# Altium footprint library B105rlc.PcbLib: 103 footprints (part 1 of 7)
Each footprint in its own frame and in the unit in brackets; x right, y up, seen from the top. Pads: shape width x height; smd on the part's side, far side on the other; paste and mask are expansions set on the pad; w line width, h text height; cw(c..) or ccw(c..) is an arc to the next point about the centre after c.
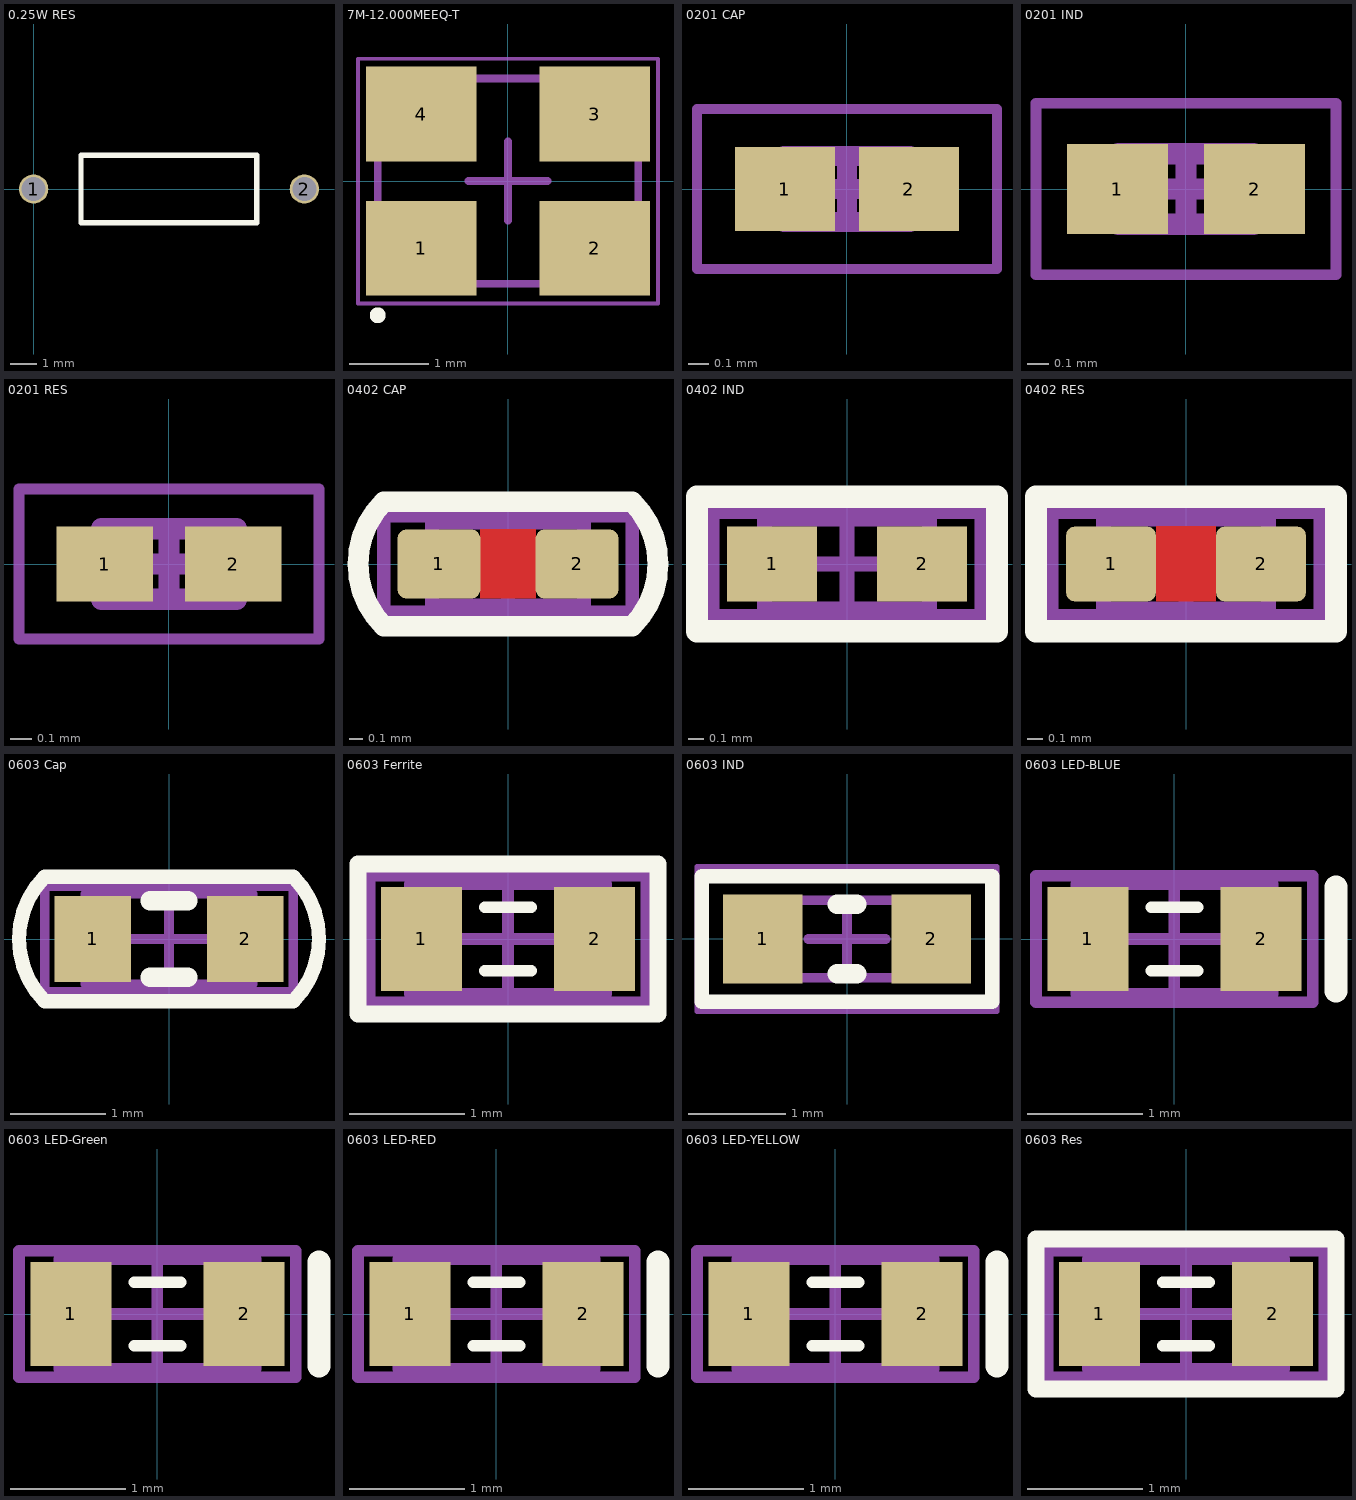
[diagram p0: the footprints below, top view; thin cyan lines are the x and y axes]

## 0.25W RES [mm]
pads (2):
  round 1.1 hole 0.9: 1(0,0) 2(10.167,0)
Top Overlay:
  lines w0.2: 1.778,-1.27 1.778,1.27 8.382,1.27 8.382,-1.27 1.778,-1.27
3D body "RESISTOR  0_25 W  0_4 IN LEAD PITCH.step": height 2.93, standoff -2.54, extent -0.254,-1.143 10.516,1.168

## 7M-12.000MEEQ-T [mm] "DFN, 4-Leads, Body 2,50x3,20mm, Pitch 2,10mm, IPC Medium Density"
height 0.8
pads (4):
  rect 1.4x1.2 smd: 1(-1.1,-0.85) 2(1.1,-0.85) 3(1.1,0.85) 4(-1.1,0.85)
Top Overlay:
  circle w0.1: c-1.65,-1.7 r0.05
Mechanical 13:
  lines w0.1: -1.65,-1.3 1.65,-1.3 1.65,1.3 -1.65,1.3 -1.65,-1.3
Mechanical 15:
  lines w0.05: -1.9,-1.55 1.9,-1.55 1.9,1.55 -1.9,1.55 -1.9,-1.55
  lines w0.1: -0.5,0 0.5,0 ; 0,-0.5 0,0.5
3D body "7M-12.000MEEQ-T.step": height 0.8, standoff 0, extent -1.65,-1.3 1.65,1.3

## 0201 CAP [mm] "Chip Capacitor, 2-Leads, Body 0,60x0,30mm, 0201, IPC Medium Density"
height 0.33
pads (2):
  rect 0.5x0.42 smd: 1(-0.31,0) 2(0.31,0)
Mechanical 13:
  lines w0.1: -0.315,-0.165 0.315,-0.165 0.315,0.165 -0.315,0.165 -0.315,-0.165
Mechanical 15:
  lines w0.05: -0.75,-0.4 0.75,-0.4 0.75,0.4 -0.75,0.4 -0.75,-0.4
  lines w0.1: -0.165,0 0.165,0 ; 0,-0.165 0,0.165
3D body "0201CAP.step": height 0.15, standoff -0.15, extent -0.3,-0.15 0.3,0.15

## 0201 IND [mm] "Chip Inductor, 2-Leads, Body 0,60x0,30mm, 0201, IPC Medium Density"
height 0.33
pads (2):
  rect 0.47x0.42 smd: 1(-0.32,0) 2(0.32,0)
Mechanical 13:
  lines w0.1: -0.315,-0.165 0.315,-0.165 0.315,0.165 -0.315,0.165 -0.315,-0.165
Mechanical 15:
  lines w0.05: -0.7,-0.4 0.7,-0.4 0.7,0.4 -0.7,0.4 -0.7,-0.4
  lines w0.1: -0.165,0 0.165,0 ; 0,-0.165 0,0.165
3D body "0201 IND.step": height 0.33, standoff 0, extent -0.315,-0.165 0.315,0.165

## 0201 RES [mm] "Chip Resistor, 2-Leads, Body 0,60x0,30mm, 0201, IPC Medium Density"
height 0.26
pads (2):
  rect 0.45x0.35 smd: 1(-0.3,0) 2(0.3,0)
Mechanical 13:
  lines w0.1: -0.315,-0.165 -0.315,0.165 0.315,0.165 0.315,-0.165 -0.315,-0.165
Mechanical 15:
  lines w0.05: -0.7,-0.35 -0.7,0.35 0.7,0.35 0.7,-0.35 -0.7,-0.35
  lines w0.1: -0.165,0 0.165,0 ; 0,-0.165 0,0.165
3D body "0201RES.step": height 0.34, standoff 0, extent -0.34,-0.165 0.34,0.165

## 0402 CAP [mm] "Chip Capacitor, Body 1.0x0.5mm, IPC High Density"
height 1.3
pads (2):
  rrect25% 0.6x0.5 smd: 1(-0.5,0) 2(0.5,0)
Top Layer:
  pour cut-out: -0.2,0.25 -0.2,-0.25 0.2,-0.25 0.2,0.25
Top Overlay:
  lines w0.15: -0.9,-0.45 cw(c-0.45,0) -0.9,0.45 0.9,0.45 cw(c0.45,0) 0.9,-0.45 -0.9,-0.45
Mechanical 13:
  lines w0.1: -0.55,-0.3 -0.55,0.3 0.55,0.3 0.55,-0.3 -0.55,-0.3
Mechanical 15:
  lines w0.1: -0.3,0 0.3,0 ; 0,-0.3 0,0.3 ; -0.9,-0.35 -0.9,0.35 0.9,0.35 0.9,-0.35 -0.9,-0.35
3D body "User Library-SMD CAPACITOR.STEP": height 0.49, standoff -0.01, extent -0.5,-0.25 0.5,0.25

## 0402 IND [mm] "Chip Inductor, Body 1.0x0.5mm, IPC High Density"
height 1.3
pads (2):
  rect 0.6x0.5 smd: 1(-0.5,0) 2(0.5,0)
Top Overlay:
  lines w0.15: -1,-0.45 1,-0.45 1,0.45 -1,0.45 -1,-0.45
Mechanical 13:
  lines w0.1: -0.55,-0.3 0.55,-0.3 0.55,0.3 -0.55,0.3 -0.55,-0.3
Mechanical 15:
  lines w0.1: -0.3,0 0.3,0 ; 0,-0.3 0,0.3 ; -0.9,-0.35 0.9,-0.35 0.9,0.35 -0.9,0.35 -0.9,-0.35
3D body "0402Ind.step": height 0.25, standoff 0, extent -0.5,-0.25 0.5,0.25

## 0402 RES [mm] "Chip Resistor, Body 1.0x0.5mm, IPC High Density"
height 0.4
pads (2):
  rrect25% 0.6x0.5 smd: 1(-0.5,0) 2(0.5,0)
Top Layer:
  pour cut-out: -0.2,0.25 -0.2,-0.25 0.2,-0.25 0.2,0.25
Top Overlay:
  lines w0.15: -1,-0.45 1,-0.45 1,0.45 -1,0.45 -1,-0.45
Mechanical 13:
  lines w0.1: -0.55,-0.3 0.55,-0.3 0.55,0.3 -0.55,0.3 -0.55,-0.3
Mechanical 15:
  lines w0.1: -0.3,0 0.3,0 ; 0,-0.3 0,0.3 ; -0.9,-0.35 0.9,-0.35 0.9,0.35 -0.9,0.35 -0.9,-0.35
3D body "0402RES.STEP": height 0.35, standoff 0, extent -0.5,-0.25 0.5,0.25

## 0603 Cap [mm] "Chip Capacitor, Body 1.6x0.8mm, IPC High Density"
height 1.3
pads (2):
  rect 0.8x0.9 smd: 1(-0.8,0) 2(0.8,0)
Top Overlay:
  lines w0.15: -1.3,-0.65 cw(c-0.65,0) -1.3,0.65 1.3,0.65 cw(c0.65,0) 1.3,-0.65 -1.3,-0.65
  lines w0.2: -0.2,-0.4 0.2,-0.4 ; -0.2,0.4 0.2,0.4
Mechanical 13:
  lines w0.1: -0.875,-0.475 0.875,-0.475 0.875,0.475 -0.875,0.475 -0.875,-0.475
Mechanical 15:
  lines w0.1: -0.475,0 0.475,0 ; 0,-0.475 0,0.475 ; -1.3,-0.55 1.3,-0.55 1.3,0.55 -1.3,0.55 -1.3,-0.55
3D body "User Library-SMD CAPACITOR 0603.step": height 0.78, standoff -0.01, extent -0.8,-0.4 0.8,0.4

## 0603 Ferrite [mm] "Chip Ferrite, Body 1.6x0.8mm, IPC High Density"
height 0.9
pads (2):
  rect 0.7x0.9 smd: 1(-0.75,0) 2(0.75,0)
Top Overlay:
  lines w0.1: -0.2,-0.275 0.2,-0.275 ; -0.2,0.275 0.2,0.275
  lines w0.15: -1.3,-0.65 1.3,-0.65 1.3,0.65 -1.3,0.65 -1.3,-0.65
Mechanical 13:
  lines w0.1: -0.85,-0.475 0.85,-0.475 0.85,0.475 -0.85,0.475 -0.85,-0.475
Mechanical 15:
  lines w0.1: -0.475,0 0.475,0 ; 0,-0.475 0,0.475 ; -1.2,-0.55 1.2,-0.55 1.2,0.55 -1.2,0.55 -1.2,-0.55
3D body "44211.stp": height 0.8, standoff 0, extent -0.8,-0.4 0.8,0.4

## 0603 IND [mm] "Chip Inductor, 2-Leads, Body 1,60x0,80mm, IPC Medium Density"
height 0.6
pads (2):
  rect 0.82x0.92 smd: 1(-0.87,0) 2(0.87,0)
Top Overlay:
  lines w0.15: -1.5,-0.65 1.5,-0.65 1.5,0.65 -1.5,0.65 -1.5,-0.65
  lines w0.2: -0.1,-0.36 0.1,-0.36 ; -0.1,0.36 0.1,0.36
Mechanical 13:
  lines w0.1: -0.8,-0.4 -0.8,0.4 0.8,0.4 0.8,-0.4 -0.8,-0.4
Mechanical 15:
  lines w0.05: -1.55,-0.75 -1.55,0.75 1.55,0.75 1.55,-0.75 -1.55,-0.75
  lines w0.1: -0.4,0 0.4,0 ; 0,-0.4 0,0.4
3D body "Coilcraft-0603 Inductor.step": height 0.52, standoff -0.01, extent -0.772,-0.381 0.772,0.381

## 0603 LED-BLUE [mm] "LED, Body 1.6x0.8mm, IPC High Density"
height 0.9
pads (2):
  rect 0.7x0.9 smd: 1(-0.75,0) 2(0.75,0)
Top Overlay:
  lines w0.1: -0.2,-0.275 0.2,-0.275 ; -0.2,0.275 0.2,0.275
  lines w0.2: 1.4,-0.45 1.4,0.45
Mechanical 13:
  lines w0.1: -0.85,-0.475 0.85,-0.475 0.85,0.475 -0.85,0.475 -0.85,-0.475
Mechanical 15:
  lines w0.1: -0.475,0 0.475,0 ; 0,-0.475 0,0.475 ; -1.2,-0.55 1.2,-0.55 1.2,0.55 -1.2,0.55 -1.2,-0.55
3D body "LED_BLUE.STEP": height 0.9, standoff 0, extent -0.85,-0.45 0.85,0.45

## 0603 LED-Green [mm] "LED, Body 1.6x0.8mm, IPC High Density"
height 0.9
pads (2):
  rect 0.7x0.9 smd: 1(-0.75,0) 2(0.75,0)
Top Overlay:
  lines w0.1: -0.2,-0.275 0.2,-0.275 ; -0.2,0.275 0.2,0.275
  lines w0.2: 1.4,-0.45 1.4,0.45
Mechanical 13:
  lines w0.1: -0.85,-0.475 0.85,-0.475 0.85,0.475 -0.85,0.475 -0.85,-0.475
Mechanical 15:
  lines w0.1: -0.475,0 0.475,0 ; 0,-0.475 0,0.475 ; -1.2,-0.55 1.2,-0.55 1.2,0.55 -1.2,0.55 -1.2,-0.55
3D body "LED-GREEN.STEP": height 0.9, standoff 0, extent -0.85,-0.45 0.85,0.45

## 0603 LED-RED [mm] "LED, Body 1.6x0.8mm, IPC High Density"
height 0.9
pads (2):
  rect 0.7x0.9 smd: 1(-0.75,0) 2(0.75,0)
Top Overlay:
  lines w0.1: -0.2,-0.275 0.2,-0.275 ; -0.2,0.275 0.2,0.275
  lines w0.2: 1.4,-0.45 1.4,0.45
Mechanical 13:
  lines w0.1: -0.85,-0.475 0.85,-0.475 0.85,0.475 -0.85,0.475 -0.85,-0.475
Mechanical 15:
  lines w0.1: -0.475,0 0.475,0 ; 0,-0.475 0,0.475 ; -1.2,-0.55 1.2,-0.55 1.2,0.55 -1.2,0.55 -1.2,-0.55
3D body "LED-RED.STEP": height 0.9, standoff 0, extent -0.85,-0.45 0.85,0.45

## 0603 LED-YELLOW [mm] "LED, Body 1.6x0.8mm, IPC High Density"
height 0.9
pads (2):
  rect 0.7x0.9 smd: 1(-0.75,0) 2(0.75,0)
Top Overlay:
  lines w0.1: -0.2,-0.275 0.2,-0.275 ; -0.2,0.275 0.2,0.275
  lines w0.2: 1.4,-0.45 1.4,0.45
Mechanical 13:
  lines w0.1: -0.85,-0.475 -0.85,0.475 0.85,0.475 0.85,-0.475 -0.85,-0.475
Mechanical 15:
  lines w0.1: -0.475,0 0.475,0 ; 0,-0.475 0,0.475 ; -1.2,-0.55 -1.2,0.55 1.2,0.55 1.2,-0.55 -1.2,-0.55
3D body "User Library-LED_0603_Y.STEP": height 0.6, standoff 0, extent -0.8,-0.4 0.8,0.4

## 0603 Res [mm] "Chip Resistor, Body 1.6x0.8mm, IPC High Density"
height 0.9
pads (2):
  rect 0.7x0.9 smd: 1(-0.75,0) 2(0.75,0)
Top Overlay:
  lines w0.1: -0.2,-0.275 0.2,-0.275 ; -0.2,0.275 0.2,0.275
  lines w0.15: -1.3,-0.65 1.3,-0.65 1.3,0.65 -1.3,0.65 -1.3,0.3 -1.3,-0.65
Mechanical 13:
  lines w0.1: -0.85,-0.475 -0.85,0.475 0.85,0.475 0.85,-0.475 -0.85,-0.475
Mechanical 15:
  lines w0.1: -0.475,0 0.475,0 ; 0,-0.475 0,0.475 ; -1.2,-0.55 -1.2,0.55 1.2,0.55 1.2,-0.55 -1.2,-0.55
3D body "User Library-RESC1608X05N 0603.step": height 0.44, standoff -0.02, extent -0.775,-0.425 0.775,0.425